# Altium footprint library Wurth_Elektronik_Electromechanic_Wire_to_Board_Connectors_rev16a.PCBLIB: 662 footprints (part 22 of 42)
Each footprint in its own frame and in the unit in brackets; x right, y up, seen from the top. Pads: shape width x height; smd on the part's side, far side on the other; paste and mask are expansions set on the pad; w line width, h text height; cw(c..) or ccw(c..) is an arc to the next point about the centre after c.
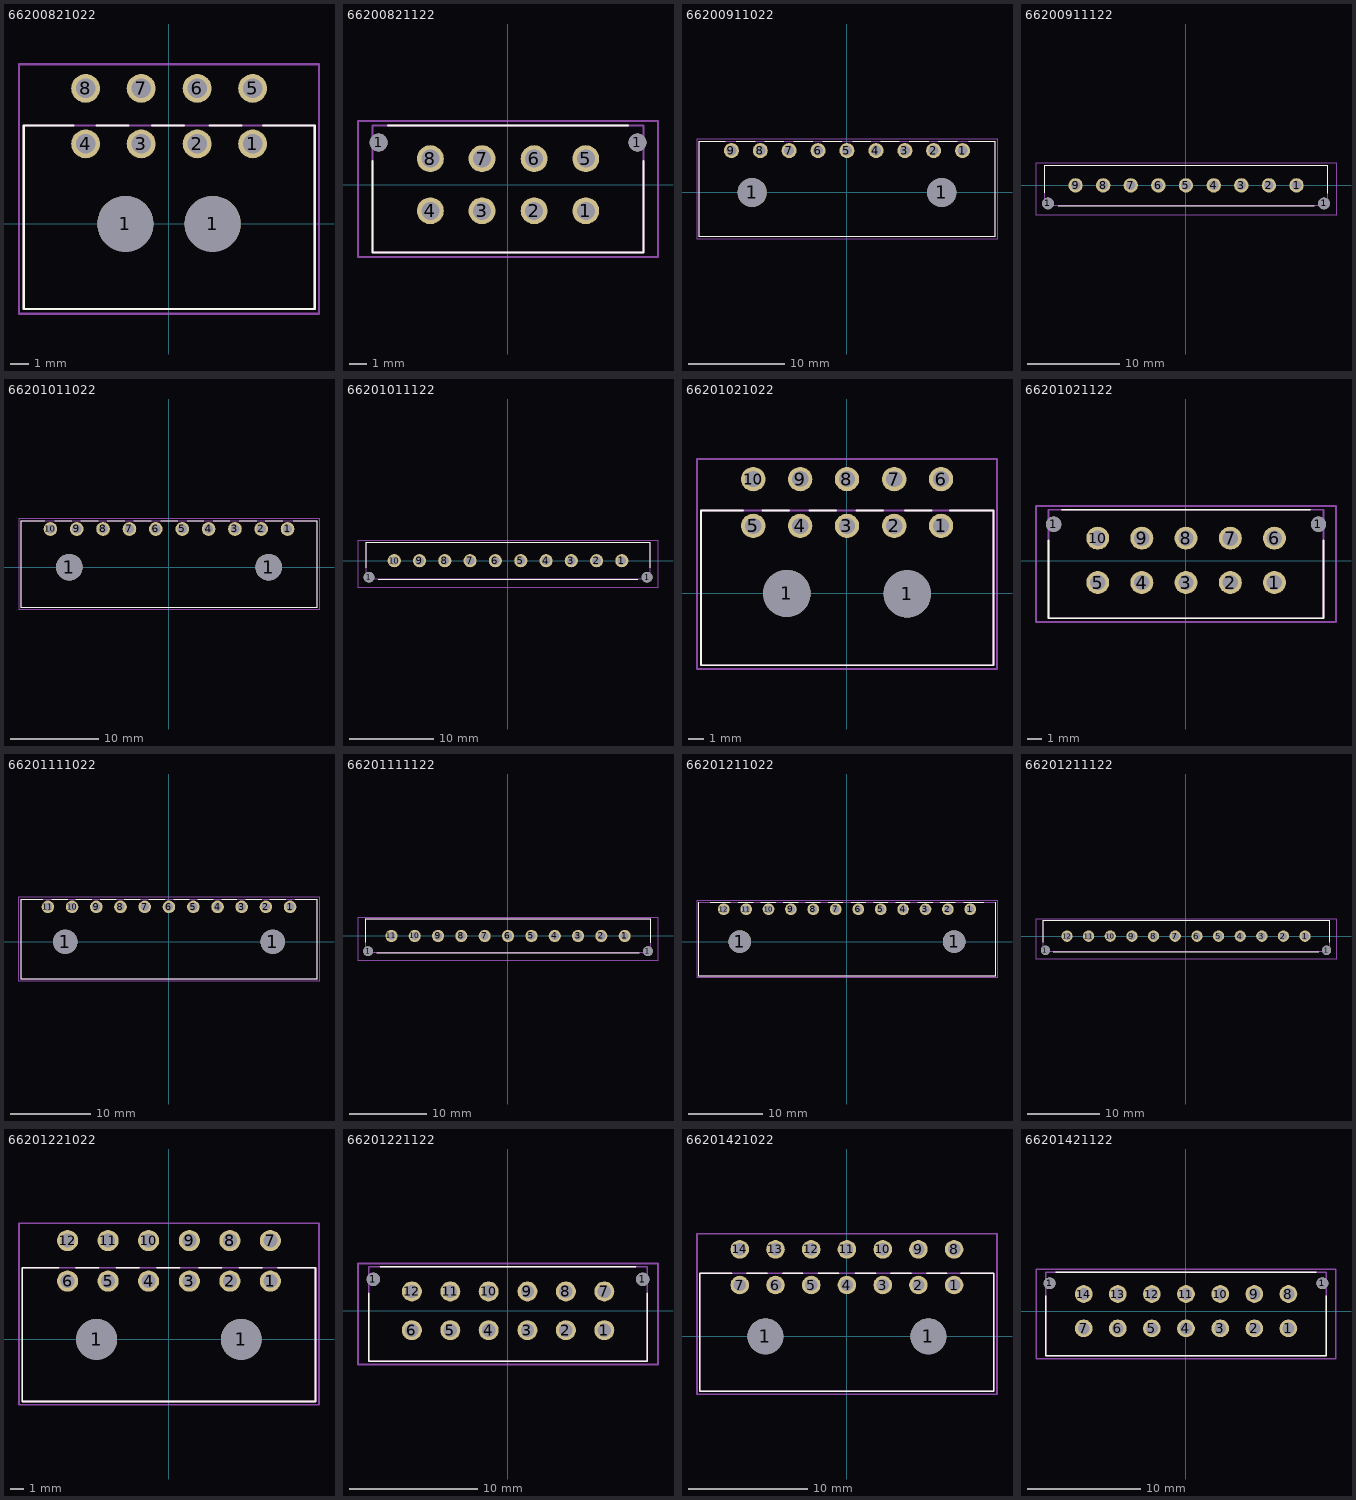
[diagram p21: the footprints below, top view; thin cyan lines are the x and y axes]

## 66200821022 [mil]
pads (10):
  round 119 hole 119: 1(-92.52,0) 1(93,0)
  round 61.5 hole 41: 1(178,170) 2(60,170) 3(-59.06,170) 4(-177.17,170) 5(178,288) 6(60,288) 7(-59.06,288) 8(-177.17,288)
Top Overlay:
  lines w5: -203.15,209 -309.06,209 -309.06,-181.1 310,-181.1 310,209 200,209 ; -153.54,209 -86.61,209 ; -35.43,209 32,209 ; 87,209 154,209
Mechanical 2:
  text ">NAME" at 378,104 h77.5
Mechanical 4:
  text ">VALUE" at 378,29 h77.5
Mechanical 16:
  lines w5: -309.06,-181.1 310,-181.1 310,209 -309.06,209 -309.06,-181.1
  text "1" at 153,154 h77.5
  text "8" at -190.94,254 h77.5
Mechanical 27:
  lines w5: -318.9,-190.94 319,-190.94 319,339 -318.9,339 -318.9,-190.94

## 66200821122 [mil]
pads (10):
  round 41 hole 41: 1(-295.28,97) 1(296,97)
  round 61.5 hole 41: 1(178,-59.06) 2(60,-59.06) 3(-59.06,-59.06) 4(-177.17,-59.06) 5(178,60) 6(60,60) 7(-59.06,60) 8(-177.17,60)
Top Overlay:
  lines w5: -309.06,54 -309.06,-154.72 310,-154.72 310,54 ; -273.62,136 274,136
Mechanical 2:
  text ">NAME" at -692.52,0 h77.5
Mechanical 4:
  text ">VALUE" at -698.23,-91.14 h77.5
Mechanical 16:
  lines w5: -309.06,-154.72 -309.06,136 310,136 310,-154.72 -309.06,-154.72
  text "1" at 153,-75 h77.5
  text "8" at -172.83,50 h77.5
Mechanical 27:
  lines w5: -342.52,-164.57 343,-164.57 343,146 -342.52,146 -342.52,-164.57

## 66200911022 [mil]
pads (11):
  round 119 hole 119: 1(-387.4,0) 1(388,0)
  round 61.5 hole 41: 1(473,171) 2(355,171) 3(237,171) 4(119,171) 5(0,171) 6(-118.11,171) 7(-236.22,171) 8(-354.33,171) 9(-472.44,171)
Top Overlay:
  lines w5: -603.35,209 -603.35,-181.1 604,-181.1 604,209 ; -602.36,209 -498.03,209 ; -453.54,209 -375.59,209 ; -335.43,209 -257.48,209 ; -217.32,209 -139.37,209 ; -99.21,209 -21.26,209 ; 23,209 98,209 ; 139,209 214,209 ; 256,209 334,209 ; 374,209 452,209 ; 498,209 603,209
Mechanical 2:
  text ">NAME" at 664,21 h77.5
Mechanical 4:
  text ">VALUE" at 664,-54.92 h77.5
Mechanical 16:
  lines w5: -603.35,-181.1 604,-181.1 604,209 -603.35,209 -603.35,-181.1
  text "9" at -477.56,146 h77.5
  text "1" at 477,146 h77.5
Mechanical 27:
  lines w5: -613.19,-190.94 614,-190.94 614,219 -613.19,219 -613.19,-190.94

## 66200911122 [mil]
pads (11):
  round 50 hole 50: 1(-590.55,-77.17) 1(591,-77.17)
  round 61.5 hole 41: 1(473,0) 2(355,0) 3(237,0) 4(119,0) 5(0,0) 6(-118.11,0) 7(-236.22,0) 8(-354.33,0) 9(-472.44,0)
Top Overlay:
  lines w5: -603.35,-32.48 -603.35,87 604,87 604,-33.27 ; -547.24,-86.22 548,-86.22
Mechanical 2:
  text ">NAME" at 670,16 h77.5
Mechanical 4:
  text ">VALUE" at 662,-66.93 h77.5
Mechanical 16:
  lines w5: -603.35,-86.02 604,-86.02 604,87 -603.35,87 -603.35,-86.02
  text "1" at 453,-19.68 h77.5
  text "9" at -490.94,-27.17 h77.5
Mechanical 27:
  lines w5: -641.73,-126.77 642,-126.77 642,96 -641.73,96 -641.73,-126.77

## 66201011022 [mil]
pads (12):
  round 119 hole 119: 1(-446.46,0) 1(447,0)
  round 61.5 hole 41: 1(532,171) 2(414,171) 3(296,171) 4(178,171) 5(60,171) 6(-59.06,171) 7(-177.17,171) 8(-295.28,171) 9(-413.39,171) 10(-531.5,171)
Top Overlay:
  lines w5: -662.4,209 -662.4,-181.1 663,-181.1 663,209 ; -661.42,209 -557.09,209 ; -512.6,209 -434.65,209 ; -394.49,209 -316.54,209 ; -276.38,209 -198.43,209 ; -158.27,209 -80.31,209 ; -36.22,209 39,209 ; 82,209 157,209 ; 199,209 273,209 ; 315,209 393,209 ; 433,209 511,209 ; 557,209 662,209
Mechanical 2:
  text ">NAME" at 723,21 h77.5
Mechanical 4:
  text ">VALUE" at 723,-54.92 h77.5
Mechanical 16:
  lines w5: -662.4,-181.1 663,-181.1 663,209 -662.4,209 -662.4,-181.1
  text "10" at -534.45,105 h77.5
  text "1" at 477,146 h77.5
Mechanical 27:
  lines w5: -672.24,-190.94 673,-190.94 673,219 -672.24,219 -672.24,-190.94

## 66201011122 [mil]
pads (12):
  round 50 hole 50: 1(-649.61,-77.17) 1(650,-77.17)
  round 61.5 hole 41: 1(532,0) 2(414,0) 3(296,0) 4(178,0) 5(60,0) 6(-59.06,0) 7(-177.17,0) 8(-295.28,0) 9(-413.39,0) 10(-531.5,0)
Top Overlay:
  lines w5: -662.4,-32.48 -662.4,87 663,87 663,-33.27 ; -606.3,-86.22 607,-86.22
Mechanical 2:
  text ">NAME" at 729,16 h77.5
Mechanical 4:
  text ">VALUE" at 721,-66.93 h77.5
Mechanical 16:
  lines w5: -662.4,-86.02 663,-86.02 663,87 -662.4,87 -662.4,-86.02
  text "1" at 512,-19.68 h77.5
  text "10" at -581.89,-27.17 h77.5
Mechanical 27:
  lines w5: -700.79,-126.77 701,-126.77 701,96 -700.79,96 -700.79,-126.77

## 66201021022 [mil]
pads (12):
  round 119 hole 119: 1(-151.57,0) 1(152,-1.18)
  round 61.5 hole 41: 1(237,170) 2(119,170) 3(0,170) 4(-118.11,170) 5(-236.22,170) 6(237,288) 7(119,288) 8(0,288) 9(-118.11,288) 10(-236.22,288)
Top Overlay:
  lines w5: -262.2,209 -368.11,209 -368.11,-181.1 369,-181.1 369,209 259,209 ; -212.6,209 -145.67,209 ; -94.49,209 -27.56,209 ; 24,209 91,209 ; 146,209 213,209
Mechanical 2:
  text ">NAME" at 437,104 h77.5
Mechanical 4:
  text ">VALUE" at 437,29 h77.5
Mechanical 16:
  lines w5: -368.11,-181.1 369,-181.1 369,209 -368.11,209 -368.11,-181.1
  text "1" at 212,154 h77.5
  text "10" at -263.78,254 h77.5
Mechanical 27:
  lines w5: -377.95,-190.94 378,-190.94 378,339 -377.95,339 -377.95,-190.94

## 66201021122 [mil]
pads (12):
  round 41 hole 41: 1(-354.33,97) 1(355,97)
  round 61.5 hole 41: 1(237,-59.06) 2(119,-59.06) 3(0,-59.06) 4(-118.11,-59.06) 5(-236.22,-59.06) 6(237,60) 7(119,60) 8(0,60) 9(-118.11,60) 10(-236.22,60)
Top Overlay:
  lines w5: -368.11,54 -368.11,-154.72 369,-154.72 369,54 ; -332.68,136 333,136
Mechanical 2:
  text ">NAME" at -758.46,0 h77.5
Mechanical 4:
  text ">VALUE" at -764.17,-91.14 h77.5
Mechanical 16:
  lines w5: -368.11,-154.72 -368.11,136 369,136 369,-154.72 -368.11,-154.72
  text "1" at 212,-75 h77.5
  text "10" at -238.78,25 h77.5
Mechanical 27:
  lines w5: -401.57,-164.57 402,-164.57 402,146 -401.57,146 -401.57,-164.57

## 66201111022 [mil]
pads (13):
  round 119 hole 119: 1(-505.51,0) 1(506,0)
  round 61.5 hole 41: 1(591,171) 2(473,171) 3(355,171) 4(237,171) 5(119,171) 6(0,171) 7(-118.11,171) 8(-236.22,171) 9(-354.33,171) 10(-472.44,171) 11(-590.55,171)
Top Overlay:
  lines w5: -721.46,209 -721.46,-181.1 722,-181.1 722,209 ; -720.47,209 -616.14,209 ; -571.65,209 -493.7,209 ; -453.54,209 -375.59,209 ; -335.43,209 -257.48,209 ; -217.32,209 -139.37,209 ; -99.21,209 -21.26,209 ; 23,209 98,209 ; 141,209 216,209 ; 258,209 332,209 ; 374,209 452,209 ; 492,209 570,209 ; 616,209 721,209
Mechanical 2:
  text ">NAME" at 782,21 h77.5
Mechanical 4:
  text ">VALUE" at 782,-54.92 h77.5
Mechanical 16:
  lines w5: -721.46,-181.1 722,-181.1 722,209 -721.46,209 -721.46,-181.1
  text "11" at -609.45,155 h77.5
  text "1" at 595,146 h77.5
Mechanical 27:
  lines w5: -731.3,-190.94 732,-190.94 732,219 -731.3,219 -731.3,-190.94

## 66201111122 [mil]
pads (13):
  round 50 hole 50: 1(-708.66,-77.17) 1(709,-77.17)
  round 61.5 hole 41: 1(591,0) 2(473,0) 3(355,0) 4(237,0) 5(119,0) 6(0,0) 7(-118.11,0) 8(-236.22,0) 9(-354.33,0) 10(-472.44,0) 11(-590.55,0)
Top Overlay:
  lines w5: -721.46,-32.48 -721.46,87 722,87 722,-33.27 ; -665.35,-86.22 666,-86.22
Mechanical 2:
  text ">NAME" at 788,16 h77.5
Mechanical 4:
  text ">VALUE" at 780,-66.93 h77.5
Mechanical 16:
  lines w5: -721.46,-86.02 722,-86.02 722,87 -721.46,87 -721.46,-86.02
  text "1" at 571,-19.68 h77.5
  text "11" at -622.83,-27.17 h77.5
Mechanical 27:
  lines w5: -759.84,-126.77 760,-126.77 760,96 -759.84,96 -759.84,-126.77

## 66201211022 [mil]
pads (14):
  round 119 hole 119: 1(-564.57,0) 1(565,0)
  round 61.5 hole 41: 1(650,171) 2(532,171) 3(414,171) 4(296,171) 5(178,171) 6(60,171) 7(-59.06,171) 8(-177.17,171) 9(-295.28,171) 10(-413.39,171) 11(-531.5,171) 12(-649.61,171)
Top Overlay:
  lines w5: -780.51,209 -780.51,-181.1 781,-181.1 781,209 ; -720.47,209 -616.14,209 ; -571.65,209 -493.7,209 ; -453.54,209 -375.59,209 ; -335.43,209 -257.48,209 ; -217.32,209 -139.37,209 ; -99.21,209 -21.26,209 ; 23,209 98,209 ; 141,209 216,209 ; 258,209 332,209 ; 374,209 452,209 ; 492,209 570,209 ; 616,209 721,209
Mechanical 2:
  text ">NAME" at 841,21 h77.5
Mechanical 4:
  text ">VALUE" at 841,-54.92 h77.5
Mechanical 16:
  lines w5: -780.51,-181.1 781,-181.1 781,209 -780.51,209 -780.51,-181.1
  text "12" at -675.39,155 h77.5
  text "1" at 654,146 h77.5
Mechanical 27:
  lines w5: -790.35,-190.94 791,-190.94 791,219 -790.35,219 -790.35,-190.94

## 66201211122 [mil]
pads (14):
  round 50 hole 50: 1(-767.72,-77.17) 1(768,-77.17)
  round 61.5 hole 41: 1(650,0) 2(532,0) 3(414,0) 4(296,0) 5(178,0) 6(60,0) 7(-59.06,0) 8(-177.17,0) 9(-295.28,0) 10(-413.39,0) 11(-531.5,0) 12(-649.61,0)
Top Overlay:
  lines w5: -780.51,-32.48 -780.51,87 781,87 781,-33.27 ; -724.41,-86.22 725,-86.22
Mechanical 2:
  text ">NAME" at 847,16 h77.5
Mechanical 4:
  text ">VALUE" at 839,-66.93 h77.5
Mechanical 16:
  lines w5: -780.51,-86.02 781,-86.02 781,87 -780.51,87 -780.51,-86.02
  text "1" at 630,-19.68 h77.5
  text "12" at -688.78,-27.17 h77.5
Mechanical 27:
  lines w5: -818.9,-126.77 819,-126.77 819,96 -818.9,96 -818.9,-126.77

## 66201221022 [mil]
pads (14):
  round 119 hole 119: 1(-210.63,0) 1(211,0)
  round 61.5 hole 41: 1(296,170) 2(178,170) 3(60,170) 4(-59.06,170) 5(-177.17,170) 6(-295.28,170) 7(296,288) 8(178,288) 9(60,288) 10(-59.06,288) 11(-177.17,288) 12(-295.28,288)
Top Overlay:
  lines w5: -321.26,209 -427.17,209 -427.17,-181.1 428,-181.1 428,209 318,209 ; -271.65,209 -204.72,209 ; -153.54,209 -86.61,209 ; -35.43,209 32,209 ; 87,209 154,209 ; 205,209 272,209
Mechanical 2:
  text ">NAME" at 496,104 h77.5
Mechanical 4:
  text ">VALUE" at 496,29 h77.5
Mechanical 16:
  lines w5: -427.17,-181.1 428,-181.1 428,209 -427.17,209 -427.17,-181.1
  text "1" at 271,154 h77.5
  text "12" at -329.72,254 h77.5
Mechanical 27:
  lines w5: -437.01,-190.94 438,-190.94 438,339 -437.01,339 -437.01,-190.94

## 66201221122 [mil]
pads (14):
  round 41 hole 41: 1(-413.39,97) 1(414,97)
  round 61.5 hole 41: 1(296,-59.06) 2(178,-59.06) 3(60,-59.06) 4(-59.06,-59.06) 5(-177.17,-59.06) 6(-295.28,-59.06) 7(296,60) 8(178,60) 9(60,60) 10(-59.06,60) 11(-177.17,60) 12(-295.28,60)
Top Overlay:
  lines w5: -427.17,54 -427.17,-154.72 428,-154.72 428,54 ; -391.73,136 392,136
Mechanical 2:
  text ">NAME" at -824.41,60 h77.5
Mechanical 4:
  text ">VALUE" at -855.12,-32.09 h77.5
Mechanical 16:
  lines w5: -427.17,-154.72 -427.17,136 428,136 428,-154.72 -427.17,-154.72
  text "1" at 271,-75 h77.5
  text "12" at -304.72,25 h77.5
Mechanical 27:
  lines w5: -460.63,-164.57 461,-164.57 461,146 -460.63,146 -460.63,-164.57

## 66201421022 [mil]
pads (16):
  round 119 hole 119: 1(-269.69,0) 1(270,0)
  round 61.5 hole 41: 1(355,170) 2(237,170) 3(119,170) 4(0,170) 5(-118.11,170) 6(-236.22,170) 7(-354.33,170) 8(355,288) 9(237,288) 10(119,288) 11(0,288) 12(-118.11,288) 13(-236.22,288) 14(-354.33,288)
Top Overlay:
  lines w5: -380.31,209 -486.22,209 -486.22,-181.1 487,-181.1 487,209 377,209 ; -330.71,209 -263.78,209 ; -212.6,209 -145.67,209 ; -94.49,209 -27.56,209 ; 28,209 95,209 ; 146,209 213,209 ; 264,209 331,209
Mechanical 2:
  text ">NAME" at 555,104 h77.5
Mechanical 4:
  text ">VALUE" at 555,29 h77.5
Mechanical 16:
  lines w5: -486.22,-181.1 487,-181.1 487,209 -486.22,209 -486.22,-181.1
  text "1" at 330,154 h77.5
  text "14" at -395.67,254 h77.5
Mechanical 27:
  lines w5: -496.06,-190.94 497,-190.94 497,339 -496.06,339 -496.06,-190.94

## 66201421122 [mil]
pads (16):
  round 41 hole 41: 1(-472.44,97) 1(473,97)
  round 61.5 hole 41: 1(355,-59.06) 2(237,-59.06) 3(119,-59.06) 4(0,-59.06) 5(-118.11,-59.06) 6(-236.22,-59.06) 7(-354.33,-59.06) 8(355,60) 9(237,60) 10(119,60) 11(0,60) 12(-118.11,60) 13(-236.22,60) 14(-354.33,60)
Top Overlay:
  lines w5: -486.22,54 -486.22,-154.72 487,-154.72 487,54 ; -450.79,136 451,136
Mechanical 2:
  text ">NAME" at -831.3,60 h77.5
Mechanical 4:
  text ">VALUE" at -862.01,-32.09 h77.5
Mechanical 16:
  lines w5: -486.22,-154.72 -486.22,136 487,136 487,-154.72 -486.22,-154.72
  text "1" at 330,-75 h77.5
  text "14" at -370.67,25 h77.5
Mechanical 27:
  lines w5: -519.68,-164.57 520,-164.57 520,146 -519.68,146 -519.68,-164.57